# Altium footprint library PcbLib.PcbLib: 116 footprints (part 4 of 8)
Each footprint in its own frame and in the unit in brackets; x right, y up, seen from the top. Pads: shape width x height; smd on the part's side, far side on the other; paste and mask are expansions set on the pad; w line width, h text height; cw(c..) or ccw(c..) is an arc to the next point about the centre after c.
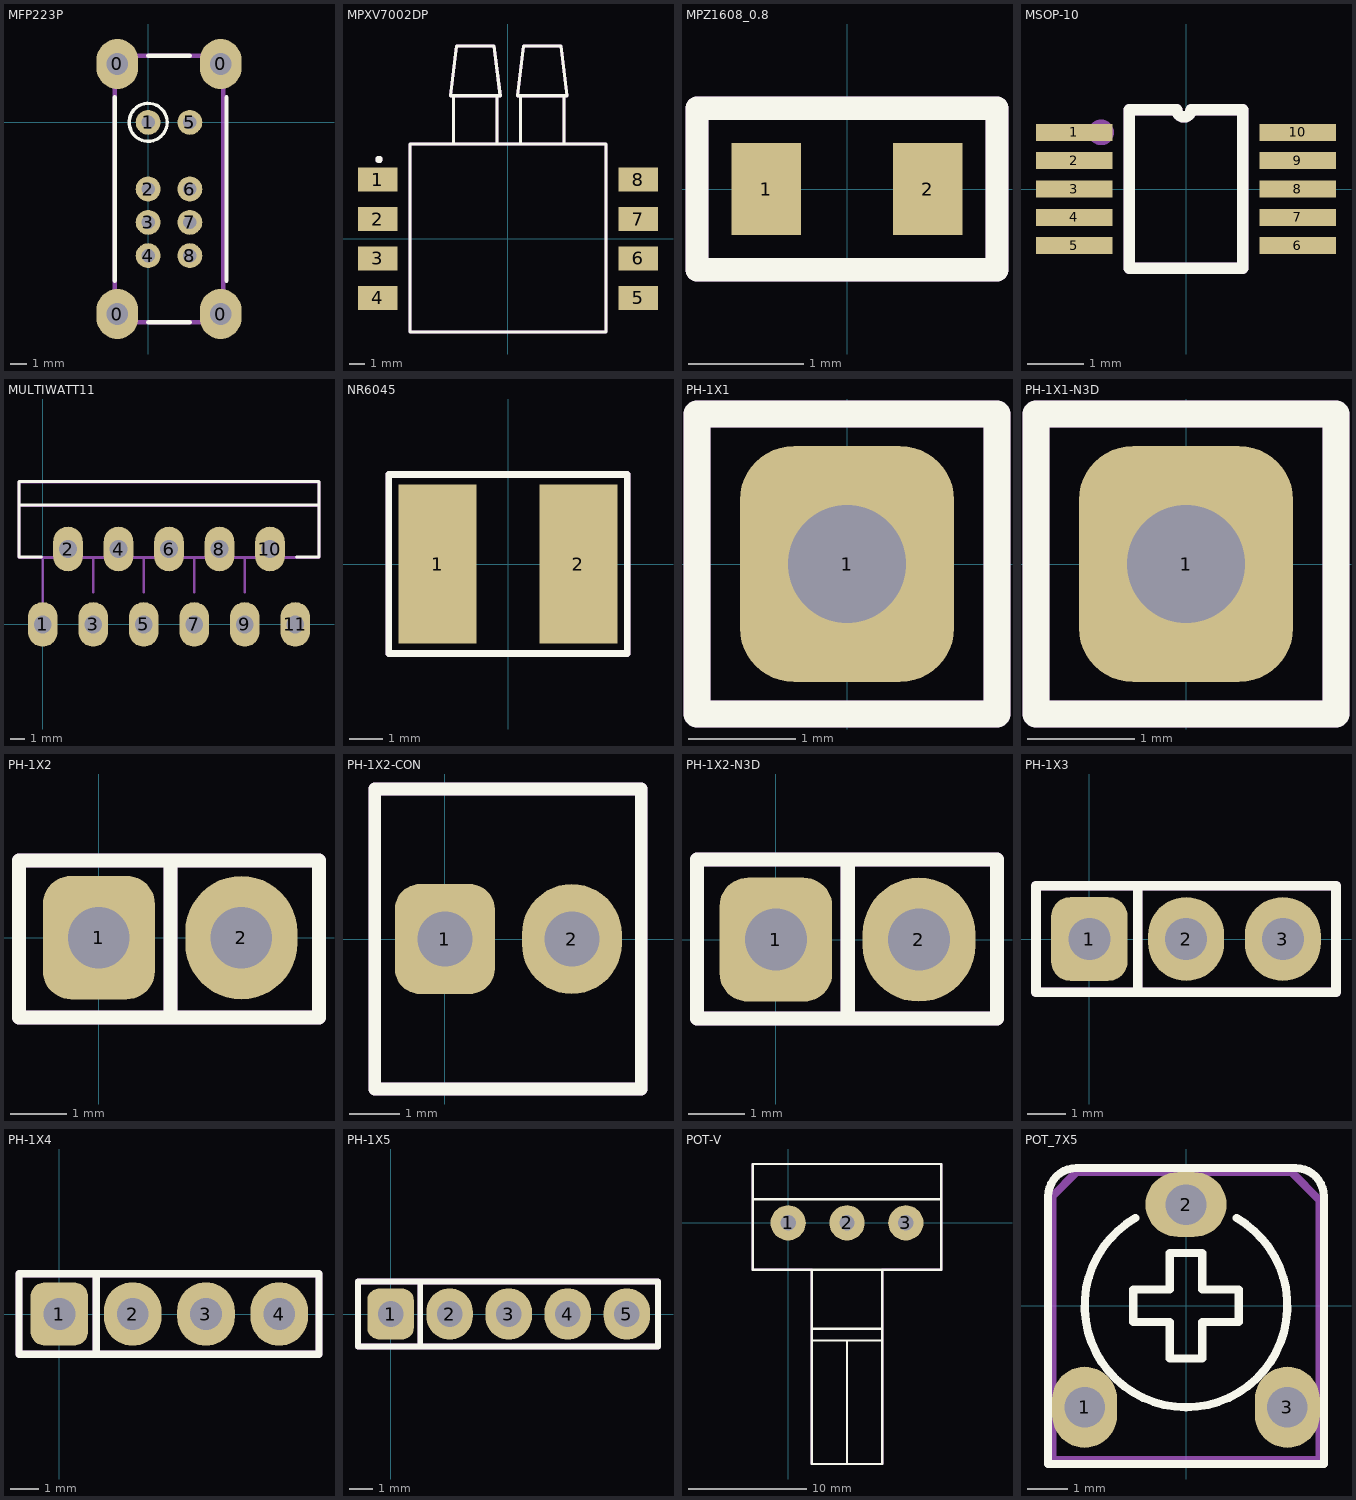
[diagram p3: the footprints below, top view; thin cyan lines are the x and y axes]

## MFP223P [mm]
pads (12):
  oval 2.5x3 hole 1.3: 0(-1.85,-11.5) 0(-1.85,3.5) 0(4.35,-11.5) 0(4.35,3.5)
  round 1.5 hole 0.8: 1(0,0) 2(0,-4) 3(0,-6) 4(0,-8) 5(2.5,0) 6(2.5,-4) 7(2.5,-6) 8(2.5,-8)
Top Overlay:
  circle w0.2: c0,0 r1.14
  lines w0.254: -2,-9.5 -2,1.5 ; 0,-12 2.5,-12 ; 0,4 2.5,4 ; 4.7,-9.5 4.7,1.5
Mechanical 29:
  circle w0.2: c0,0 r0.5
  lines w0.254: -2,-12 4.5,-12 4.5,4 -2,4 -2,-12
  text ".Designator" at -0.3,-4.467 h1
3D body "Assem1.STEP": height 14.68, standoff -2.82, extent -2,-12 4.7,4

## MPXV7002DP [mm]
pads (8):
  rect 2.54x1.52 smd: 1(-8.38,3.81) 2(-8.38,1.27) 3(-8.38,-1.27) 4(-8.38,-3.81) 5(8.38,-3.81) 6(8.38,-1.27) 7(8.38,1.27) 8(8.38,3.81)
Top Overlay:
  circle w0.254: c-8.3,5.1 r0.1
  lines w0.2: -3.5,6.1 -3.5,9.2 ; -0.7,6.1 -0.7,9.2 ; 0.8,6.1 0.8,9.2 ; 3.6,6.1 3.6,9.2 ; -6.3,-6 -6.3,6.1 6.3,6.1 6.3,-6 -6.3,-6 ; -3.7,9.2 -3.3,12.4 -0.9,12.4 -0.5,9.2 -3.7,9.2 ; 0.6,9.2 1,12.4 3.4,12.4 3.8,9.2 0.6,9.2
Mechanical 29:
  circle w0.254: c-8.3,5.1 r0.1
  lines w0.2: -3.5,6.1 -3.5,9.2 ; -0.7,6.1 -0.7,9.2 ; 0.8,6.1 0.8,9.2 ; 3.6,6.1 3.6,9.2 ; -6.3,-6 -6.3,6.1 6.3,6.1 6.3,-6 -6.3,-6 ; -3.7,9.2 -3.3,12.4 -0.9,12.4 -0.5,9.2 -3.7,9.2 ; 0.6,9.2 1,12.4 3.4,12.4 3.8,9.2 0.6,9.2
  text ".Designator" at -0.9,-0.167 h1
3D body "MPXV7002DP.STEP": height 9.72, standoff -0.32, extent -8.263,-6 8.263,12.415

## MPZ1608_0.8 [mm]
pads (2):
  rect 0.6x0.8 smd: 1(-0.7,0) 2(0.7,0)
Top Overlay:
  lines w0.2: -1.3,-0.7 -1.3,0.7 1.3,0.7 1.3,-0.7 -1.3,-0.7
Mechanical 29:
  lines w0.2: -1.3,-0.7 1.3,-0.7 1.3,0.7 -1.3,0.7 -1.3,-0.7
  text ".Designator" at -0.6,-0.233 h0.5
3D body "Part4.STEP": height 0.8, standoff 0, extent -0.8,-0.4 0.8,0.4

## MSOP-10 [mm]
pads (10):
  rect 1.35x0.3 smd mask+0.05: 1(-1.975,1) 2(-1.975,0.5) 3(-1.975,0) 4(-1.975,-0.5) 5(-1.975,-1) 6(1.975,-1) 7(1.975,-0.5) 8(1.975,0) 9(1.975,0.5) 10(1.975,1)
Top Overlay:
  lines w0.2: 0.962,1.4 0.087,1.4 cw(c-0.038,1.4) -0.162,1.4 -1,1.4 -1,-1.4 1,-1.4 1,1.4
Mechanical 29:
  circle w0.254: c-1.5,1 r0.1
  lines w0.2: 0.962,1.4 0.087,1.4 cw(c-0.038,1.4) -0.162,1.4 -1,1.4 -1,-1.4 1,-1.4 1,1.4
  text ".Designator" at 0.233,-1 h0.8
3D body "User Library-msop-10.step": height 1.15, standoff 0, extent -2.45,-1.5 2.45,1.5

## MULTIWATT11 [mm]
pads (11):
  oval 2x3 hole 1.2: 1(0,0) 2(1.7,5.08) 3(3.4,0) 4(5.1,5.08) 5(6.8,0) 6(8.5,5.08) 7(10.2,0) 8(11.9,5.08) 9(13.6,0) 10(15.3,5.08) 11(17,0)
Top Overlay:
  lines w0.2: -1.6,8.04 18.6,8.04 ; -0.1,4.54 -1.6,4.54 -1.6,9.64 18.6,9.64 18.6,4.54 17.1,4.54
Mechanical 29:
  circle w0.254: c0,0 r0.5
  lines w0.2: -1.6,8 18.6,8 ; 0,0.5 0,4.5 ; 3.4,2.2 3.4,4.5 ; 6.8,2.2 6.8,4.5 ; 10.2,2.2 10.2,4.5 ; 13.6,2.2 13.6,4.5 ; -1.6,4.5 18.6,4.5 18.6,9.6 -1.6,9.6 -1.6,4.5
  text ".Designator" at 5.5,6.033 h1
3D body "L6203.STEP": height 23, standoff -2.4, extent -1.6,-0.285 18.6,9.605

## NR6045 [mm]
pads (2):
  rect 2.35x4.8 smd: 1(-2.125,0) 2(2.125,0)
Top Overlay:
  lines w0.2: -3.6,-2.7 -3.6,0.2 -3.6,2.7 3.6,2.7 3.6,-2.7 -3.6,-2.7
Mechanical 29:
  lines w0.2: -3.6,-2.7 -3.6,0.2 -3.6,2.7 3.6,2.7 3.6,-2.7 -3.6,-2.7
  text ".Designator" at -0.8,-0.467 h1
3D body "User Library-SRN6045TA Series.step": height 4.3, standoff 0.1, extent -3,-3 3,3

## PH-1X1 [mm] "2.54mm"
pads (1):
  rrect50% 2x2.2 hole 1.1 mask+0.102: 1(0,0)
Top Overlay:
  lines w0.254: -1.4,-1.4 -1.4,1.4 1.4,1.4 1.4,-1.4 -1.4,-1.4
Mechanical 29:
  lines w0.254: -1.4,-1.4 -1.4,1.4 1.4,1.4 1.4,-1.4 -1.4,-1.4
  text ".Designator" at -0.55,-0.392 h1
3D body "Pin Header 1x1 TH Pitch 2.54mm.stp": height 9.5, standoff -3.2, extent -1.27,-1.27 1.27,1.27

## PH-1X1-N3D [mm] "2.54mm"
pads (1):
  rrect50% 2x2.2 hole 1.1 mask+0.102: 1(0,0)
Top Overlay:
  lines w0.254: -1.4,-1.4 -1.4,1.4 1.4,1.4 1.4,-1.4 -1.4,-1.4
Mechanical 29:
  lines w0.254: -1.4,-1.4 -1.4,1.4 1.4,1.4 1.4,-1.4 -1.4,-1.4
  text ".Designator" at -0.55,-0.392 h1

## PH-1X2 [mm] "2.54mm"
pads (2):
  rrect50% 2x2.2 hole 1.1 mask+0.102: 1(0,0)
  oval 2x2.2 hole 1.1 mask+0.102: 2(2.54,0)
Top Overlay:
  lines w0.254: 1.275,-1.4 1.275,1.35 ; -1.425,-1.425 -1.425,1.375 3.925,1.375 3.925,-1.425 -1.425,-1.425
Mechanical 29:
  lines w0.254: 1.275,-1.4 1.275,1.35 ; -1.425,-1.425 -1.425,1.375 3.925,1.375 3.925,-1.425 -1.425,-1.425
  text ".Designator" at -0.8,-0.467 h1
3D body "Pin Header 1x2 TH Pitch 2.54mm.stp": height 9.5, standoff -3.2, extent -1.29,-1.29 3.79,1.25

## PH-1X2-CON [mm] "2.54mm"
pads (2):
  rrect50% 2x2.2 hole 1.1 mask+0.102: 1(0,0)
  oval 2x2.2 hole 1.1 mask+0.102: 2(2.54,0)
Top Overlay:
  lines w0.254: -1.4,-3 3.925,-3 3.925,3 -1.4,3 -1.4,-3
Mechanical 29:
  lines w0.254: -1.4,-3 3.925,-3 3.925,3 -1.4,3 -1.4,-3
  text ".Designator" at -0.8,-0.467 h1
3D body "User Library-Part1-228.step": height 12.5, standoff -1.5, extent -1.225,-3.025 3.775,2.975

## PH-1X2-N3D [mm] "2.54mm"
pads (2):
  rrect50% 2x2.2 hole 1.1 mask+0.102: 1(0,0)
  oval 2x2.2 hole 1.1 mask+0.102: 2(2.54,0)
Top Overlay:
  lines w0.254: 1.275,-1.4 1.275,1.35 ; -1.4,-1.4 -1.4,1.425 3.925,1.425 3.925,-1.4 -1.4,-1.4
Mechanical 29:
  lines w0.254: 1.275,-1.4 1.275,1.35 ; -1.4,-1.4 -1.4,1.425 3.925,1.425 3.925,-1.4 -1.4,-1.4
  text ".Designator" at -0.8,-0.467 h1

## PH-1X3 [mm] "2.54mm"
pads (3):
  rrect50% 2x2.2 hole 1.1 mask+0.102: 1(0,0)
  oval 2x2.2 hole 1.1 mask+0.102: 2(2.54,0) 3(5.08,0)
Top Overlay:
  lines w0.254: 1.275,-1.4 1.275,1.35 ; -1.4,-1.4 6.475,-1.4 6.475,1.4 -1.4,1.4 -1.4,-1.4
Mechanical 29:
  lines w0.254: 1.275,-1.4 1.275,1.35 ; -1.4,-1.4 -1.4,1.4 6.475,1.4 6.475,-1.4 -1.4,-1.4
  text ".Designator" at 2.2,-0.467 h1
3D body "Pin Header 1x3 TH Pitch 2.54mm.stp": height 9.5, standoff -3.2, extent -1.27,-1.27 6.35,1.27

## PH-1X4 [mm] "2.54mm"
pads (4):
  rrect50% 2x2.2 hole 1.1: 1(0,0)
  oval 2x2.2 hole 1.1 mask+0.102: 2(2.54,0) 3(5.08,0) 4(7.62,0)
Top Overlay:
  lines w0.254: 1.275,-1.4 1.275,1.35 ; -1.4,-1.4 9,-1.4 9,1.4 -1.4,1.4 -1.4,-1.4
Mechanical 29:
  lines w0.254: 1.275,-1.4 1.275,1.35 ; -1.4,-1.4 -1.4,1.4 9,1.4 9,-1.4 -1.4,-1.4
  text ".Designator" at 2.9,-0.467 h1
3D body "Pin Header 1x4 TH Pitch 2.54mm.stp": height 9.5, standoff -3.2, extent -1.27,-1.27 8.89,1.27

## PH-1X5 [mm] "2.54mm"
pads (5):
  rrect50% 2x2.2 hole 1.1: 1(0,0)
  oval 2x2.2 hole 1.1 mask+0.102: 2(2.54,0) 3(5.08,0) 4(7.62,0) 5(10.16,0)
Top Overlay:
  lines w0.254: 1.275,-1.4 1.275,1.35 ; -1.4,-1.4 11.5,-1.4 11.5,1.4 -1.4,1.4 -1.4,-1.4
Mechanical 29:
  lines w0.254: 1.275,-1.4 1.275,1.35 ; -1.4,-1.4 -1.4,1.4 11.5,1.4 11.5,-1.4 -1.4,-1.4
  text ".Designator" at 3.9,-0.467 h1
3D body "Pin Header 1x5 TH Pitch 2.54mm.stp": height 9.5, standoff -3.2, extent -1.27,-1.27 11.43,1.27

## POT-V [mm]
pads (3):
  round 3 hole 1.3: 1(0,0) 2(5,0) 3(10,0)
Top Overlay:
  lines w0.2: -3,2 13,2 ; 2,-10 8,-10 ; 2,-4 2,-9 ; 5,-20.5 5,-10 ; 8,-4 8,-9 ; 2,-9 2,-20.5 8,-20.5 8,-9 ; 2,-9 8,-9 ; -3,-4 -3,5 13,5 13,-4 -3,-4
Mechanical 29:
  lines w0.2: -3,-4 2,-4 2,-20.5 8,-20.5 8,-4 13,-4 13,5 -3,5 -3,-4
  text ".Designator" at 3.2,-0.467 h1
3D body "User Library-Pot(2).STEP": height 21.14, standoff -3.5, extent -2.874,-20.632 12.874,4.926

## POT_7X5 [mm] "POT, TRIM, 7.5X5.0mm, pitch: 5.0mm"
pads (3):
  oval 1.6x2 hole 1: 1(-2.5,-2.5) 3(2.5,-2.5)
  oval 2x1.6 hole 1: 2(0,2.5)
Top Overlay:
  lines w0.2: -1.25,2.165 ccw(c0,0) 1.25,2.165 ; -3.4,-3.9 3.4,-3.9 3.4,2.7 ccw(c2.7,2.7) 2.7,3.4 -2.7,3.4 ccw(c-2.7,2.7) -3.4,2.7 -3.4,-3.9 ; -1.3,-0.4 -0.4,-0.4 -0.4,-1.3 0.4,-1.3 0.4,-0.4 1.3,-0.4 1.3,0.4 0.4,0.4 0.4,1.3 -0.4,1.3 -0.4,0.4 -1.3,0.4 -1.3,-0.4
Mechanical 29:
  lines w0.2: -3.3,-3.8 -3.3,2.7 -2.7,3.3 2.6,3.3 3.3,2.6 3.3,-3.8 -3.3,-3.8
  text ".Designator" at -1.3,-0.667 h1
3D body "User Library-Pot - RES_VAR1.STEP": height 7.5, standoff -3.4, extent -3.25,-3.775 3.25,3.275